# Altium footprint library First Board IMX6.PcbLib: 204 footprints (part 11 of 13)
Each footprint in its own frame and in the unit in brackets; x right, y up, seen from the top. Pads: shape width x height; smd on the part's side, far side on the other; paste and mask are expansions set on the pad; w line width, h text height; cw(c..) or ccw(c..) is an arc to the next point about the centre after c.
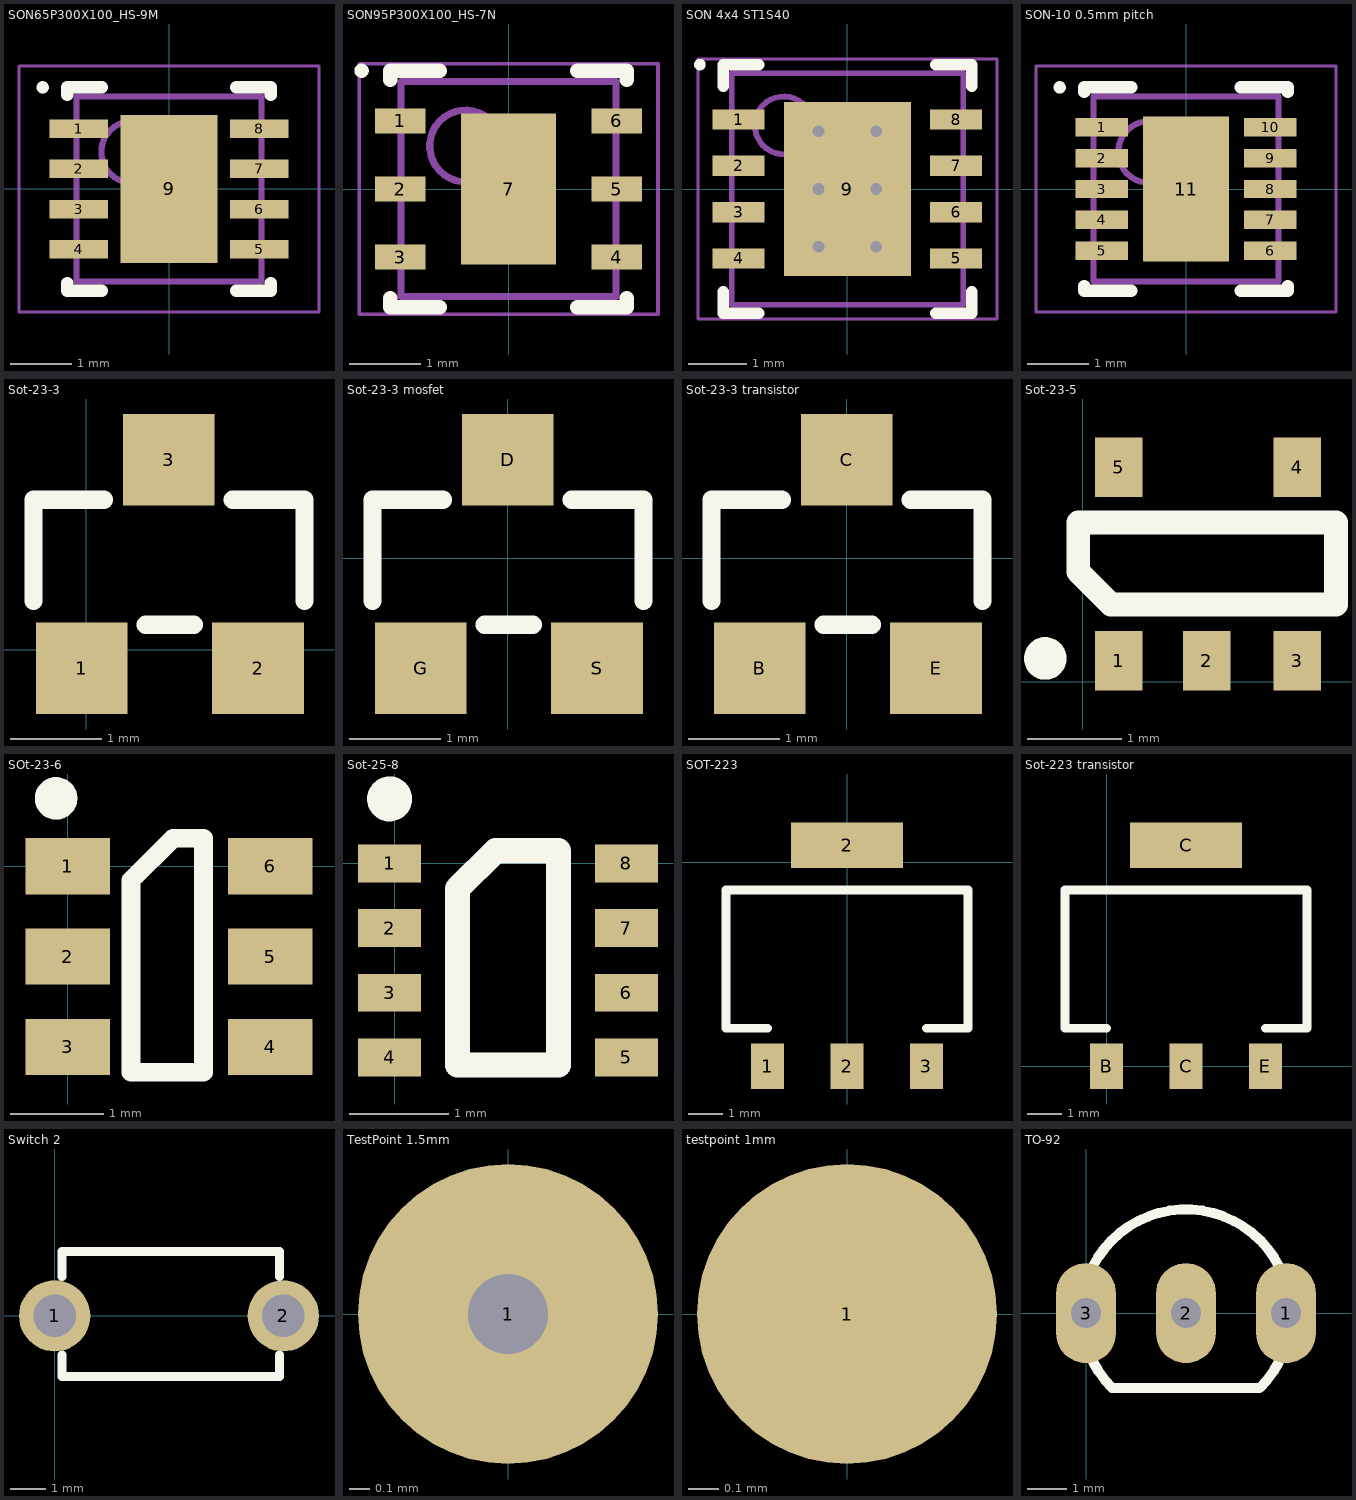
[diagram p10: the footprints below, top view; thin cyan lines are the x and y axes]

## SON65P300X100_HS-9M [mm] "SON, 8-Leads, Body 3,00x3,00mm, Pitch 0,65mm, Thermal Pad 2,40x1,58mm, IPC Low Density"
height 1
pads (9):
  rect 0.95x0.3 smd: 1(-1.465,0.975) 2(-1.465,0.325) 3(-1.465,-0.325) 4(-1.465,-0.975) 5(1.465,-0.975) 6(1.465,-0.325) 7(1.465,0.325) 8(1.465,0.975)
  rect 1.58x2.4 smd: 9(0,0)
Top Overlay:
  circle w0.1: c-2.05,1.65 r0.05
  lines w0.2: -1.65,-1.525 -1.65,-1.65 -1.09,-1.65 ; -1.65,1.525 -1.65,1.65 -1.09,1.65 ; 1.09,-1.65 1.65,-1.65 1.65,-1.525 ; 1.09,1.65 1.65,1.65 1.65,1.525
Mechanical 13:
  circle w0.1: c-0.6,0.6 r0.5
  lines w0.1: -1.5,-1.5 1.5,-1.5 1.5,1.5 -1.5,1.5 -1.5,-1.5
Mechanical 15:
  lines w0.05: -2.435,-2 2.435,-2 2.435,2 -2.435,2 -2.435,-2
  lines w0.1: -0.5,0 0.5,0 ; 0,-0.5 0,0.5
3D body: height 1, standoff 0.02, extent -1.5,-1.5 1.5,1.5

## SON95P300X100_HS-7N [mm] "SON, 6-Leads, Body 3,00x3,00mm, Pitch 0,95mm, Thermal Pad 2,10x1,32mm, IPC Medium Density"
height 1
pads (7):
  rect 0.7x0.35 smd: 1(-1.51,0.95) 2(-1.51,0) 3(-1.51,-0.95) 4(1.51,-0.95) 5(1.51,0) 6(1.51,0.95)
  rect 1.32x2.1 smd: 7(0,0)
Top Overlay:
  circle w0.1: c-2.05,1.65 r0.05
  lines w0.2: -1.65,-1.525 -1.65,-1.65 -0.96,-1.65 ; -1.65,1.525 -1.65,1.65 -0.96,1.65 ; 0.96,-1.65 1.65,-1.65 1.65,-1.525 ; 0.96,1.65 1.65,1.65 1.65,1.525
Mechanical 13:
  circle w0.1: c-0.6,0.6 r0.5
  lines w0.1: -1.5,-1.5 1.5,-1.5 1.5,1.5 -1.5,1.5 -1.5,-1.5
Mechanical 15:
  lines w0.05: -2.085,-1.75 2.085,-1.75 2.085,1.75 -2.085,1.75 -2.085,-1.75
  lines w0.1: -0.5,0 0.5,0 ; 0,-0.5 0,0.5
3D body: height 1, standoff 0.1, extent -1.5,-1.5 1.5,1.5

## SON 4x4 ST1S40 [mm] "SON, 8-Leads, Body 4,00x4,00mm, Pitch 0,80mm, Thermal Pad 3,00x2,20mm, IPC Medium Density"
height 0.9
pads (9):
  rect 0.9x0.35 smd: 1(-1.88,1.2) 2(-1.88,0.4) 3(-1.88,-0.4) 4(-1.88,-1.2) 5(1.88,-1.2) 6(1.88,-0.4) 7(1.88,0.4) 8(1.88,1.2)
  rect 2.2x3 smd paste-1.1: 9(0,0)
via -0.5,1 diameter 0.46 hole 0.2
via 0.5,1 diameter 0.46 hole 0.2
via -0.5,0 diameter 0.46 hole 0.2
via 0.5,0 diameter 0.46 hole 0.2
via -0.5,-1 diameter 0.46 hole 0.2
via 0.5,-1 diameter 0.46 hole 0.2
Top Overlay:
  circle w0.1: c-2.55,2.15 r0.05
  lines w0.2: -2.15,-1.775 -2.15,-2.15 -1.53,-2.15 ; -2.15,1.775 -2.15,2.15 -1.53,2.15 ; 1.53,-2.15 2.15,-2.15 2.15,-1.775 ; 1.53,2.15 2.15,2.15 2.15,1.775
Top Paste:
  rectangle: -1,0.1 -0.1,1.4
  rectangle: -1,-1.4 -0.1,-0.1
  rectangle: 0.1,0.1 1,1.4
  rectangle: 0.1,-1.4 1,-0.1
Top Assembly:
  circle w0.1: c-1.1,1.1 r0.5
  lines w0.1: -2,-2 -2,2 2,2 2,-2 -2,-2
Top Courtyard:
  lines w0.05: -2.585,-2.25 -2.585,2.25 2.585,2.25 2.585,-2.25 -2.585,-2.25
  lines w0.1: -0.5,0 0.5,0 ; 0,-0.5 0,0.5
3D body: height 0.9, standoff 0.1, extent -2,-2 2,2

## SON-10 0.5mm pitch [mm] "SON, 10-Leads, Body 3,00x3,00mm, Pitch 0,50mm, Thermal Pad 2,35x1,18mm, IPC Low Density"
height 0.9
pads (11):
  rect 0.85x0.3 smd: 1(-1.365,1) 2(-1.365,0.5) 3(-1.365,0) 4(-1.365,-0.5) 5(-1.365,-1) 6(1.365,-1) 7(1.365,-0.5) 8(1.365,0) 9(1.365,0.5) 10(1.365,1)
  rect 1.4x2.35 smd: 11(0,0)
Top Overlay:
  circle w0.1: c-2.05,1.65 r0.05
  lines w0.2: -1.65,-1.575 -1.65,-1.65 -0.89,-1.65 ; -1.65,1.575 -1.65,1.65 -0.89,1.65 ; 0.89,-1.65 1.65,-1.65 1.65,-1.575 ; 0.89,1.65 1.65,1.65 1.65,1.575
Mechanical 13:
  circle w0.1: c-0.6,0.6 r0.5
  lines w0.1: -1.5,-1.5 -1.5,1.5 1.5,1.5 1.5,-1.5 -1.5,-1.5
Mechanical 15:
  lines w0.05: -2.435,-2 -2.435,2 2.435,2 2.435,-2 -2.435,-2
  lines w0.1: -0.5,0 0.5,0 ; 0,-0.5 0,0.5
3D body: height 0.9, standoff 0.02, extent -1.5,-1.5 1.5,1.5

## Sot-23-3 [mm]
pads (3):
  rect 1x1 smd: 1(-0.05,-0.2) 2(1.875,-0.2) 3(0.9,2.075)
Top Overlay:
  lines w0.2: -0.575,0.534 -0.575,1.638 ; -0.555,1.638 0.194,1.638 ; 0.65,0.275 1.175,0.275 ; 1.6,1.637 2.362,1.637 ; 2.382,0.534 2.382,1.637
3D body "SOT-23-3.step": height 1.08, standoff -0.02, extent -0.575,-0.3 2.425,2.2

## Sot-23-3 mosfet [mm]
pads (3):
  rect 1x1 smd: D(0,1.075) G(-0.95,-1.2) S(0.975,-1.2)
Top Overlay:
  lines w0.2: -1.475,-0.466 -1.475,0.638 ; -1.455,0.638 -0.706,0.638 ; -0.25,-0.725 0.275,-0.725 ; 0.7,0.637 1.462,0.637 ; 1.482,-0.466 1.482,0.637
3D body "SOT-23-3.step": height 1.08, standoff -0.02, extent -1.475,-1.3 1.525,1.2

## Sot-23-3 transistor [mm]
pads (3):
  rect 1x1 smd: B(-0.95,-1.2) C(0,1.075) E(0.975,-1.2)
Top Overlay:
  lines w0.2: -1.475,-0.466 -1.475,0.638 ; -1.455,0.638 -0.706,0.638 ; -0.25,-0.725 0.275,-0.725 ; 0.7,0.637 1.462,0.637 ; 1.482,-0.466 1.482,0.637
3D body "SOT-23-3.step": height 1.08, standoff -0.02, extent -1.475,-1.3 1.525,1.2

## Sot-23-5 [mil]
pads (5):
  rect 20x25 smd: 1(15,8.86) 2(52,8.86) 3(90,8.86) 4(90,90.16) 5(15,90.16)
Top Overlay:
  circle w10: c-15.75,9.84 r3.94
  lines w10: -1.97,46.26 -1.97,66.93 106.3,66.93 106.3,32.48 11.81,32.48 -1.97,46.26
3D body "SOT-23-5.step": height 41.65, standoff -1.65, extent -7.05,0.79 111.06,99.22

## SOt-23-6 [mm]
pads (6):
  rect 0.9x0.6 smd: 1(0,0) 2(0,-0.965) 3(0,-1.93) 4(2.163,-1.93) 5(2.163,-0.965) 6(2.163,0)
Top Overlay:
  circle w0.254: c-0.125,0.725 r0.1
  lines w0.2: 0.675,-2.2 1.45,-2.2 1.45,0.3 1.125,0.3 0.675,-0.15 0.675,-2.2
3D body "SOT-23-6.step": height 1.09, standoff 0, extent -0.125,-2.347 2.301,0.447

## Sot-25-8 [mil]
pads (8):
  rect 25x15 smd: 1(-1.97,0) 2(-1.97,-25.66) 3(-1.97,-51.31) 4(-1.97,-76.97) 5(91.97,-76.97) 6(91.97,-51.31) 7(91.97,-25.66) 8(91.97,0)
Top Overlay:
  circle w10: c-1.97,25.59 r3.94
  lines w10: 25,-80 25,-10 40,5 65,5 65,-80 25,-80
3D body "sot-23-8.step": height 47.24, standoff 0, extent -10.12,-96.88 100.12,18.87

## SOT-223 [mm]
pads (4):
  rect 0.95x1.32 smd mask+0.3: 1(-2.3,-5.9) 2(0,-5.9) 3(2.3,-5.9)
  rect 3.25x1.32 smd mask+0.3: 2(0,0.5)
Top Overlay:
  lines w0.254: -2.3,-4.8 -2.5,-4.8 -3.1,-4.8 -3.5,-4.8 -3.5,-0.8 1.7,-0.8 3.5,-0.8 3.5,-4.8 3.1,-4.8 2.3,-4.8
3D body "SOT-223.step": height 1.7, standoff 0.02, extent -3.25,-6.28 3.25,0.68

## Sot-223 transistor [mm]
pads (4):
  rect 0.95x1.32 smd mask+0.3: B(0,0) C(2.3,0) E(4.6,0)
  rect 3.25x1.32 smd mask+0.3: C(2.3,6.4)
Top Overlay:
  lines w0.254: 0,1.1 -0.2,1.1 -0.8,1.1 -1.2,1.1 -1.2,5.1 4,5.1 5.8,5.1 5.8,1.1 5.4,1.1 4.6,1.1
3D body "SOT-223.step": height 1.7, standoff 0.02, extent -0.95,-0.38 5.55,6.58

## Switch 2 [mm]
pads (2):
  round 2 hole 1.2 mask+0.1: 1(0,0) 2(6.4,0)
Top Overlay:
  lines w0.254: 0.2,-1.1 0.2,-1.7 6.3,-1.7 6.3,-1.1 ; 0.2,1.1 0.2,1.8 6.3,1.8 6.3,1.1
3D body "Pushbutton smd 3x4x2.step": height 2, standoff 0, extent 0.707,-1.35 5.607,1.55

## TestPoint 1.5mm [mm]
pads (1):
  round 1.5 smd: 1(0,0)
via 0,0 diameter 0.6 hole 0.4

## testpoint 1mm [mm]
pads (1):
  round 1 smd: 1(0,0)

## TO-92 [mil]
pads (3):
  oval 60x100 hole 30: 1(200,0) 2(100,0) 3(0,0)
Top Overlay:
  lines w10: 173.72,-75.04 ccw(c100,-0.85) 26.24,-75 173.72,-75
3D body "TO92.step": height 285.04, standoff -159.79, extent -8.87,-60 208.87,101.42